# Altium schematic symbol library Hydra_Ref_sch.SCHLIB: 791 symbols (part 2 of 5)
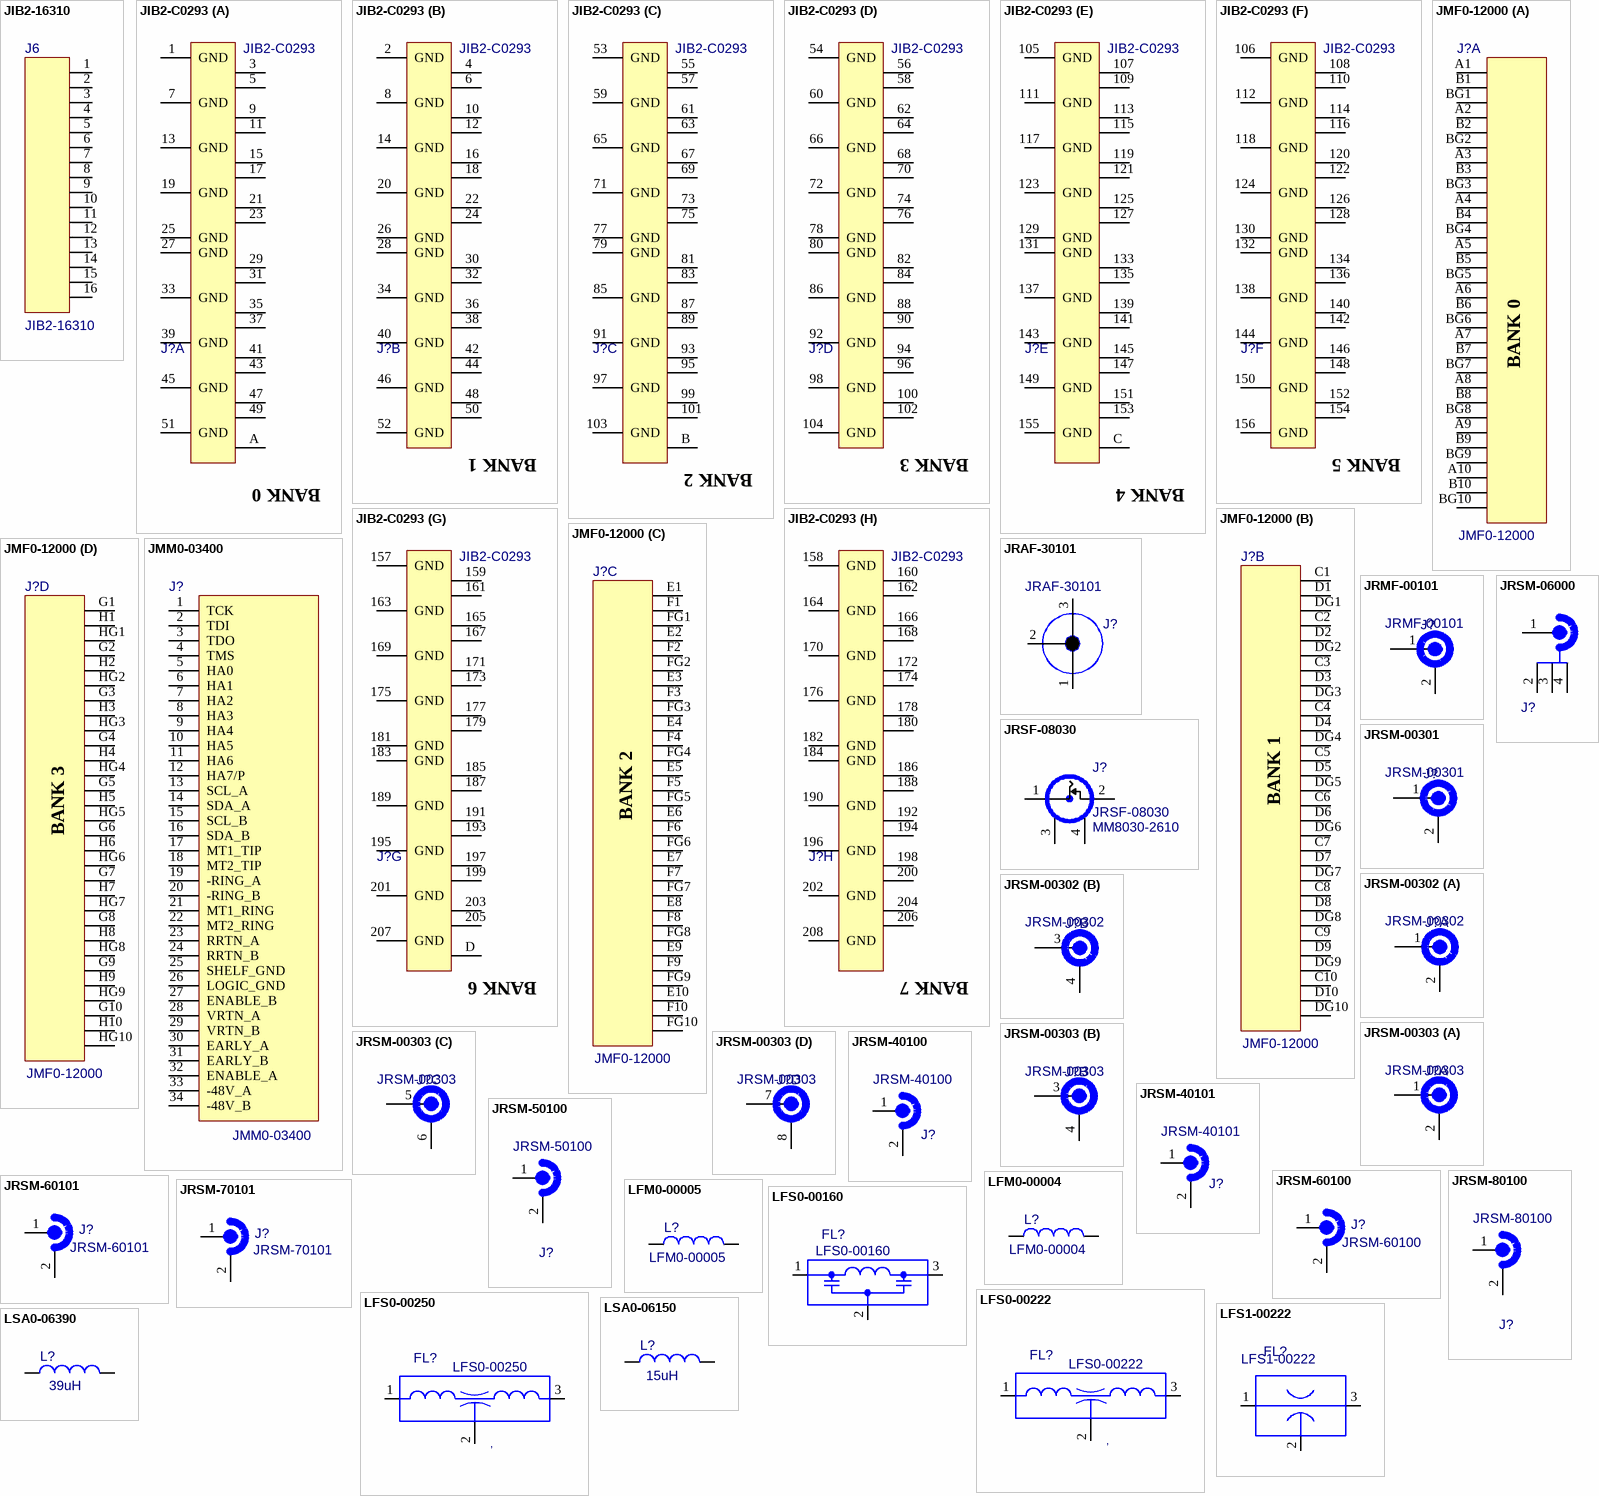
[diagram p23: symbols JIB2-16310 to LSA0-06390]

## JMF0-12000
designator J?, comment G_PN: JMF0-12000  (hidden comment: CONN;8-SIG/4-GND X 10 COL;FEM;RT ANG;PRESS-FIT;TCA;Z-PACK)
NoLoad: .; M_PN: 649001-1; Approved: CL; Value: 649001-1; MFGR: TYCO; level: 1; ModifyDate: 5/10/12; item_number: JMF0-12000
footprint CONN-JMF0-12000 (CONN; 8-SIG/4-GNDX10 COL;RT ANG; PRESS-FIT; Z-PACK)
part A pins: A1, A2, A3, A4, A5, A6, A7, A8, A9, A10, B1, B2, B3, B4, B5, B6, B7, B8, B9, B10, BG1, BG2, BG3, BG4, BG5, BG6, BG7, BG8, BG9, BG10
part B pins: C1, C2, C3, C4, C5, C6, C7, C8, C9, C10, D1, D2, D3, D4, D5, D6, D7, D8, D9, D10, DG1, DG2, DG3, DG4, DG5, DG6, DG7, DG8, DG9, DG10
part C pins: E1, E2, E3, E4, E5, E6, E7, E8, E9, E10, F1, F2, F3, F4, F5, F6, F7, F8, F9, F10, FG1, FG2, FG3, FG4, FG5, FG6, FG7, FG8, FG9, FG10
part D pins: G1, G2, G3, G4, G5, G6, G7, G8, G9, G10, H1, H2, H3, H4, H5, H6, H7, H8, H9, H10, HG1, HG2, HG3, HG4, HG5, HG6, HG7, HG8, HG9, HG10
part A text: BANK 0
part B text: BANK 1
part C text: BANK 2
part D text: BANK 3

## JMM0-03400
designator J?, comment G_PN: JMM0-03400  (hidden comment: CONN;26-1AMP & 8-6A;MALE;RT ANG;PC MT;PRESS-FIT;ATCA)
NoLoad: .; Approved: CL; Value: 176650-1; MFGR: TE; level: 1; ModifyDate: 5/10/12; M_PN: 176650-1; item_number: JMM0-03400
footprint CONN-JMF0-03400
pins: 1 TCK, 2 TDI, 3 TDO, 4 TMS, 5 HA0, 6 HA1, 7 HA2, 8 HA3, 9 HA4, 10 HA5, 11 HA6, 12 HA7/P, 13 SCL_A, 14 SDA_A, 15 SCL_B, 16 SDA_B, 17 MT1_TIP, 18 MT2_TIP, 19 -RING_A, 20 -RING_B, 21 MT1_RING, 22 MT2_RING, 23 RRTN_A, 24 RRTN_B, 25 SHELF_GND, 26 LOGIC_GND, 27 ENABLE_B, 28 VRTN_A, 29 VRTN_B, 30 EARLY_A, 31 EARLY_B, 32 ENABLE_A, 33 -48V_A, 34 -48V_B

## JRAF-30101
designator J?, comment G_PN: JRAF-30101  (hidden comment: SMA Right ANgle Jack PCB)
MFGR: Rosenberger; Approved: NM; NoLoad: .; M_PN: 32K243-40ML5; level: 1; ModifyDate: 11/14/12; item_number: JRAF-30101
footprint SMA -32K243-40ML5
footprint SMA_32K243-40ML5
pins: 1, 2, 3

## JRMF-00101
designator J?, comment G_PN: JRMF-00101  (hidden comment: MCX F PC MOUNT RIGHT ANGLE .1)
Value: 85MCX-50-0-10; MFGR: RADIAL; Approved: CL; NoLoad: .; level: 1; M_PN: 85MCX-50-0-10; ModifyDate: 4/21/12; item_number: JRMF-00101
pins: 1, 2 GND

## JRSF-08030
designator J?  M_PN: MM8030-2610  G_PN: JRSF-08030
SWG TYPE; FEMALE;SPST SWITCH CONNECTOR;STRAIGHT;SMT; Value: MM8030-2610; MFGR: MURATA; NoLoad: .; level: 1; ModifyDate: 8/21/13; item_number: JRSF-08030
footprint CONN-JRSF-MURATA-MM8030-2610 (SWG Type F SMT receptacle, integrated SPST switch)
pins: 1 RFIN, 2 GND, 3 GND1, 4 GND2

## JRSM-00301
designator J?, comment G_PN: JRSM-00301  (hidden comment: SMPM;SB EDGE LAUNCH;MALE;1 PORT)
Value: 3211-60035; MFGR: SV MICROWAVE; Approved: CL; NoLoad: .; level: 1; M_PN: 3211-60035; ModifyDate: 5/14/12; item_number: JRSM-00301
footprint CONN-3211-60035_plane_cutout (SMPM MALE 1 PORT EDGE MOUNT - SV Microwave, Inc)
pins: 1, 2 GND

## JRSM-00302
designator J?, comment G_PN: JRSM-00302  (hidden comment: SMPM;SB EDGE LAUNCH;MALE;2 PORT)
Value: 3211-60103; MFGR: SV MICROWAVE; Approved: CL; NoLoad: .; level: 1; M_PN: 3211-60103; ModifyDate: 5/14/12; item_number: JRSM-00302
footprint CONN-3211-60103 (SMPM SB MALE 2 PORT EDGE MOUNT - SV Microwave, Inc)
part A pins: 1, 2 GND
part B pins: 3, 4 GND

## JRSM-00303
designator J?, comment G_PN: JRSM-00303  (hidden comment: SMPM;SB EDGE LAUNCH;MALE;4 PORT)
Value: 3211-60102; MFGR: SV MICROWAVE; Approved: CL; NoLoad: .; level: 1; M_PN: 3211-60102; ModifyDate: 5/14/12; item_number: JRSM-00303
footprint CONN-3211-60102 (SMPM SB MALE 4 PORT EDGE MOUNT - SV Microwave, Inc)
part A pins: 1, 2 GND
part B pins: 3, 4 GND
part C pins: 5, 6 GND
part D pins: 7, 8 GND

## JRSM-06000
designator J?, comment SSMT;M;PCB;.177X.197X.081;SURF MT  (value not drawn)
Value: 2367-0000-54; MFGR: M/ACOM; G_PN: JRSM-06000; NoLoad: .; Approved: CL; level: 1; M_PN: 2367-0000-54; ModifyDate: 3/16/12; item_number: JRSM-06000
footprint CONN-2367-0000-54 (STRAIGHT OSMT PCB MOUNT PLUG RECEPTACLE -AMP)
pins: 1 CNTR, 2 GND, 3 GND, 4 GND

## JRSM-40100
designator J?, comment G_PN: JRSM-40100  (hidden comment: SMPM;FD;MALE;STRAIGHT;SMT;.152X.152X.150;PCB;R/A CONTACT)
Value: 3287-6100; MFGR: SV MICROWAVE; Approved: CL; NoLoad: .; level: 1; M_PN: 3287-6100; ModifyDate: 6/6/12; item_number: JRSM-40100
footprint CONN-3287-610X (SMMP;M;PCB;.152X.152X.150;SURF MT)
pins: 1 CNTR, 2 GND

## JRSM-40101
designator J?, comment G_PN: JRSM-40101  (hidden comment: SMPM;SB;MALE;STRAIGHT;SMT;.152X.152X.150;PCB;R/A CONTACT)
Value: 3287-6101; MFGR: SV MICROWAVE; Approved: CL; NoLoad: .; level: 1; M_PN: 3287-6101; ModifyDate: 4/10/13; item_number: JRSM-40101
footprint CONN-3287-610X (SMMP;M;PCB;.152X.152X.150;SURF MT)
pins: 1 CNTR, 2 GND

## JRSM-50100
designator J?, comment G_PN: JRSM-50100  (hidden comment: SMPM;FD;MALE;STRAIGHT;PCB;.145X.145X.194;PCB;4 LEG;THRU-HOLE)
Value: 3287-4100; MFGR: SV MICROWAVE; Approved: CL; NoLoad: .; level: 1; M_PN: 3287-4100; ModifyDate: 6/6/12; item_number: JRSM-50100
footprint CONN-JRSM-50100 (.094 PCB-MALE)
pins: 1 CNTR, 2 GND

## JRSM-60100
designator J?, comment G_PN: JRSM-60100  (hidden comment: SMPM FD MALE,STRAIGHT SMT, R/A COPLANAR, 4 PIN THRU-HOLE)
Value: B012-P93-02; MFGR: GILBERT; Approved: CL; NoLoad: .; level: 1; M_PN: B012-P93-02; ModifyDate: 6/6/12; item_number: JRSM-60100
footprint CONN-JRSM-60100_NO_TH_R (.063" PCB ONLY-MALE COMPANAR SURFACE MOUNT)
pins: 1 CNTR, 2 GND

## JRSM-60101
designator J?, comment G_PN: JRSM-60101  (hidden comment: SMPM SM MALE,STRAIGHT SMT, R/A COPLANAR, 4 PIN THRU-HOLE)
Value: B012-P95-02; MFGR: GILBERT; Approved: CL; NoLoad: .; level: 1; M_PN: B012-P95-02; ModifyDate: 1/6/14; item_number: JRSM-60101
footprint CONN-JRSM-60100_NO_TH_R (.063" PCB ONLY-MALE COMPANAR SURFACE MOUNT)
pins: 1 CNTR, 2 GND

## JRSM-70101
designator J?, comment G_PN: JRSM-70101  (hidden comment: SMPM FD MALE,STRAIGHT SMT, R/A COPLANAR, 4 PIN THRU-HOLE)
Value: B012-P93-02; MFGR: GILBERT; Approved: CL; NoLoad: .; level: 1; M_PN: B012-P93-02; ModifyDate: 10/15/14; item_number: JRSM-70101
footprint CONN-JRSM-60100_NO_TH_R (.063" PCB ONLY-MALE COMPANAR SURFACE MOUNT)
pins: 1 CNTR, 2 GND

## JRSM-80100
designator J?, comment G_PN: JRSM-80100  (hidden comment: SMPM;FD;MALE;STRAIGHT;SMT;.152X.152X.150;PCB;R/A CONTACT)
Value: B012-P93-01; MFGR: Corning Gilbert; Approved: CL; NoLoad: .; level: 1; M_PN: B012-P93-01; ModifyDate: 10/15/14; item_number: JRSM-80100
footprint CONN-3287-610X (SMMP;M;PCB;.152X.152X.150;SURF MT)
pins: 1 CNTR, 2 GND

## LFM0-00004
designator L?, comment G_PN: LFM0-00004  (hidden comment: EMI FLTR;CHIP;1A;300-330 OHMS@100M;0805)
MFGR: ASSOCIATED COMPONENTS TECH; NoLoad: .; Approved: CL; M_PN: CBC0805-300-102; level: 1; ModifyDate: 4/9/12; item_number: LFM0-00004
footprint IND-0805-RF (CB*0805 ACT Inc)
pins: 1, 2

## LFM0-00005
designator L?, comment G_PN: LFM0-00005  (hidden comment: EMI FILTER;CHIP;330 OHMS@100MHZ;0.5A;0.30 DCR;0603)
MFGR: MuRata; NoLoad: .; Approved: NM; M_PN: BLM18AG331SN1; level: 1; ModifyDate: 10/24/12; item_number: LFM0-00005
footprint BLM18A_Murata (EMI FILTER, 0603)
pins: 1, 2

## LFS0-00160
designator FL?, comment G_PN: LFS0-00160  (hidden comment: F/T FILTER;CHIP;3A;16V;PI LC;16PF;400MHz;0805)
Approved: CL; NoLoad: .; M_PN: NFL21SP407X1C3D; MFGR: MURATA; level: 1; ModifyDate: 3/25/13; Value: 16pF; item_number: LFS0-00160
footprint FIL-0805-MUR (Footprint not found)
pins: 1 IN, 2 GND, 3 OUT

## LFS0-00222
designator FL?, comment G_PN: LFS0-00222  (hidden comment: Filter EMI 2200PF,1206)
Approved: CL; NoLoad: .; M_PN: NFE31PT222Z1E9BL; MFGR: MURATA; level: 1; ModifyDate: 02/22/12; Value: 2200pF; item_number: LFS0-00222
footprint FIL-NFE31P-1206-4P (Chip EMIFIL LC Combined Type NFE31P(1206 Size), 3.2mmX1.6mmX1.6mm)
pins: 1 IN, 2 GND, 3 OUT
text: ,

## LFS0-00250
designator FL?, comment G_PN: LFS0-00250  (hidden comment: F/T FILTER;CHIP;2.5 DCR150MA;16V;T LC;25PF;200MHz;0603)
Approved: NM; NoLoad: .; M_PN: NFL18ST207X1C3; MFGR: MURATA; level: 1; ModifyDate: 02/22/12; Value: 25pF; item_number: LFS0-00250
footprint FIL-NFL18ST (0603 series NFL18ST)
pins: 1 IN, 2 GND, 3 OUT
text: ,

## LFS1-00222
designator FL?, comment G_PN: LFS1-00222  (hidden comment: NFM18CC222R1C3)
2200 PF FEED THRU FILTER 0603; Value: 2200pF; Approved: NM; MFGR: muRata; NoLoad: .; level: 1; ModifyDate: 11/14/12; M_PN: NFM18CC222R1C3; item_number: LFS1-00222
footprint FIL-NFL18C (0603 series NFL18C)
pins: 1, 2, 3

## LSA0-06150
designator L?, comment 15uH
IND; 15UH; 5%; 30MHZ SRF; 3.7 OHM; 1008; M_PN: 1008LS-153XJLB; G_PN: LSA0-06150; NoLoad: .; MFGR: Coilcraft; Approved: CL; level: 1; ModifyDate: 3/10/11; Value: 15uH; item_number: LSA0-06150
footprint IND-1008CS (Coilcraft 1008CS SM Inductor 115X110X80(mil))
pins: 1, 2

## LSA0-06390
designator L?, comment value 39uH  (hidden comment: IND; 39UH; 5%; 26MHZ SRF; 10 OHM; 1008)
G_PN: LSA0-06390; M_PN: 1008LS-393XJLB; NoLoad: .; Approved: CL; MFGR: COILCRAFT; level: 1; ModifyDate: 3/23/12; item_number: LSA0-06390
footprint IND-1008CS (Coilcraft 1008CS SM Inductor 115X110X80(mil))
pins: 1, 2

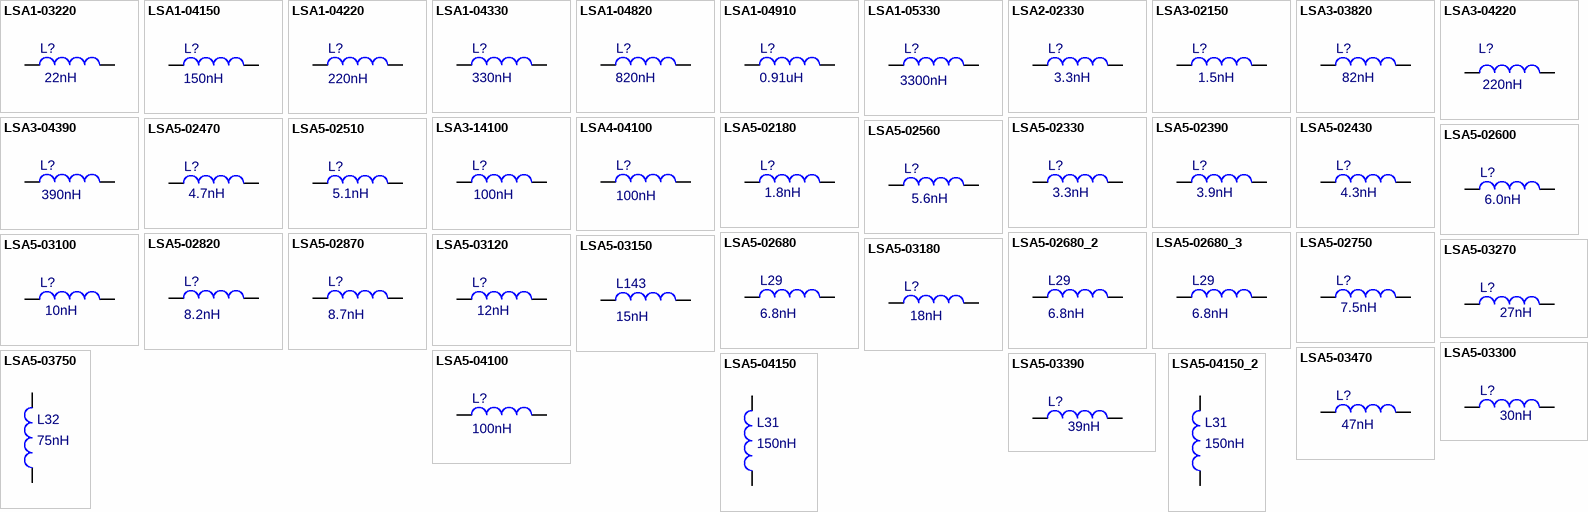
[diagram p6: symbols LSA1-03220 to LSA5-04150_2]

## LSA1-03220
designator L?, comment value 22nH  (hidden comment: INDUCTOR;22NH;5%;1008;.115X.110;SMT)
G_PN: LSA1-03220; M_PN: 1008CS-220XJLB; MFGR: COILCRAFT; NoLoad: .; Approved: CL; level: 1; ModifyDate: 02/22/12; item_number: LSA1-03220
footprint IND-1008CS (Coilcraft 1008CS SM Inductor 115X110X80(mil))
pins: 1, 2

## LSA1-04150
designator L?, comment value 150nH  (hidden comment: INDUCTOR;.15 UH;2%;850 MHZ SRF;45Q @100MHZ;.7 DCR;580MA;WIREWOUND;1008)
G_PN: LSA1-04150; M_PN: 1008CS-151XGLB; MFGR: COILCRAFT; NoLoad: .; Approved: CL; level: 1; ModifyDate: 02/22/12; item_number: LSA1-04150
footprint IND-1008CS (Coilcraft 1008CS SM Inductor 115X110X80(mil))
pins: 1, 2

## LSA1-04220
designator L?, comment value 220nH  (hidden comment: INDUCTOR;220NH;2%;1008;.115X.110;SMT)
G_PN: LSA1-04220; MFGR: COILCRAFT; NoLoad: .; Approved: CL; M_PN: 1008CS-221XGLB; level: 1; ModifyDate: 4/11/12; item_number: LSA1-04220
footprint IND-1008CS (Coilcraft 1008CS SM Inductor 115X110X80(mil))
pins: 1, 2

## LSA1-04330
designator L?, comment value 330nH  (hidden comment: INDUCTOR;.33 UH;5%;570 MHZ SRF;45Q @100MHZ;1.05 DCR;450MA;WIREWOUND;1008)
M_PN: 1008CS-331XJLB; G_PN: LSA1-04330; NoLoad: .; Approved: CL; MFGR: COILCRAFT; level: 1; ModifyDate: 02/22/12; item_number: LSA1-04330
footprint IND-1008CS (Coilcraft 1008CS SM Inductor 115X110X80(mil))
pins: 1, 2

## LSA1-04820
designator L?, comment value 820nH  (hidden comment: INDUCTOR;.82UH;5%;350 MHZ SRF;45Q @100MHZ;1.61 DCR;400MA;WIREWOUND;1008)
MFGR: COILCRAFT; NoLoad: .; Approved: CL; M_PN: 1008CS-821XJLB; G_PN: LSA1-04820; level: 1; ModifyDate: 02/22/12; item_number: LSA1-04820
footprint IND-1008CS (Coilcraft 1008CS SM Inductor 115X110X80(mil))
pins: 1, 2

## LSA1-04910
designator L?, comment value 0.91uH  (hidden comment: INDUCTOR;0.91UH;5%;320MHZ SRF;35Q @50MHZ;1.68 DCR;.38A;1008)
MFGR: COILCRAFT; NoLoad: .; Approved: NM; M_PN: 1008CS-911XJLU; G_PN: LSA1-04910; level: 1; ModifyDate: 10/24/12; item_number: LSA1-04910
footprint IND-1008CS (Coilcraft 1008CS SM Inductor 115X110X80(mil))
pins: 1, 2

## LSA1-05330
designator L?, comment value 3300nH  (hidden comment: 3.3 UH;5%;110MHZ SRF;22Q @25MHZ;3.4 OHMS;.29A;1008)
G_PN: LSA1-05330; M_PN: 1008CS-332XJLB; MFGR: COILCRAFT; NoLoad: .; Approved: CL; level: 1; ModifyDate: 5/16/12; item_number: LSA1-05330
footprint IND-1008CS (Coilcraft 1008CS SM Inductor 115X110X80(mil))
pins: 1, 2

## LSA2-02330
designator L?, comment value 3.3nH  (hidden comment: INDUCTOR;3.3NH;2%;12.8G SRF;95Q @1.7G;.045DCR;1.7A;0402)
G_PN: LSA2-02330; NoLoad: .; Approved: CL; M_PN: 0402HP-3N3XGLU; MFGR: COILCRAFT; level: 1; ModifyDate: 2/14/13; item_number: LSA2-02330
footprint IND-0402CS (Coilcraft 0402CS SM Inductor 47X25X26(mil))
pins: 1, 2

## LSA3-02150
designator L?, comment value 1.5nH  (hidden comment: INDUCTOR;1.5NH;+/-.2NH;13GHZ SRF;50Q@.8GHZ;06)
G_PN: LSA3-02150; NoLoad: .; Approved: CL; M_PN: 5516 0158451; MFGR: STELCO; level: 1; ModifyDate: 09/19/12; item_number: LSA3-02150
footprint IND-0603CS-Stelco (Coilcraft 0603CS SM Inductor 71X44X40(mil))
pins: 1, 2

## LSA3-03820
designator L?, comment 82nH
INDUCTOR;82NH;5%;1G SRF;40Q@.5G;300MA;0603; G_PN: LSA3-03820; NoLoad: .; Approved: CL; M_PN: LL1608-FSL82NJ; MFGR: TOKO; level: 1; ModifyDate: 4/11/12; Value: 82nH; item_number: LSA3-03820
footprint IND-0603-LL1608FSL (METRIC 1608 With plarity marking)
pins: 1, 2

## LSA3-04220
designator L?, comment value 220nH  (hidden comment: INDUCTOR;220NH;1%;822MHz SRF;0603)
G_PN: LSA3-04220; NoLoad: .; Approved: CL; M_PN: 0603CS-R22XGLU; MFGR: COILCRAFT; level: 1; ModifyDate: 4/11/12; item_number: LSA3-04220
footprint IND-0603CS (Coilcraft 0603CS SM Inductor 71X44X40(mil))
pins: 1, 2

## LSA3-04390
designator L?, comment value 390nH  (hidden comment: INDUCTOR;390NH;5%;.78GHZ SRF;25Q;4.35 DCR;100MA;WIREWOUND;0603)
G_PN: LSA3-04390; M_PN: 0603CS-R39XJLU; NoLoad: .; Approved: CL; MFGR: COILCRAFT; level: 1; ModifyDate: 02/22/12; item_number: LSA3-04390
footprint IND-0603CS (Coilcraft 0603CS SM Inductor 71X44X40(mil))
pins: 1, 2

## LSA3-14100
designator L?, comment value 100nH  (hidden comment: INDUCTOR;100NH;5%;1.4GHZ SRF;34Q;.58 DCR;400MA;WIREWOUND;0603)
M_PN: 0603CS-R10XJBU; MFGR: COILCRAFT; NoLoad: .; Approved: CL; G_PN: LSA3-14100; level: 1; ModifyDate: 02/22/12; item_number: LSA3-14100
footprint IND-0603CS (Coilcraft 0603CS SM Inductor 71X44X40(mil))
pins: 1, 2

## LSA4-04100
designator L?, comment value 100nH  (hidden comment: INDUCTOR;100NH;5%;1G SRF;60Q@.35G;650MA;1008)
G_PN: LSA4-04100; MFGR: COILCRAFT; NoLoad: .; Approved: CL; M_PN: 1008CS-101XJLB; level: 1; ModifyDate: 12/13/12; item_number: LSA4-04100
footprint IND-1008CS (Coilcraft 1008CS SM Inductor 115X110X80(mil))
pins: 1, 2

## LSA5-02180
designator L?, comment value 1.8nH  (hidden comment: INDUCTOR;1.8NH;5%;16G SRF;65Q @1.7G;.18 DCR;.033A;0603)
G_PN: LSA5-02180; M_PN: 0603HP-1N8XJLU; MFGR: COILCRAFT; NoLoad: .; Approved: CL; level: 1; ModifyDate: 5/16/13; item_number: LSA5-02180
footprint IND-0603HP (Coilcraft 0603HP SM Inductor 69X43X37(mil))
pins: 1, 2

## LSA5-02330
designator L?, comment value 3.3nH  (hidden comment: INDUCTOR;3.3NH;2%;9.6G SRF;104Q @1.7G;.024 DCR;1.9A;0603)
G_PN: LSA5-02330; M_PN: 0603HP-3N3XGLU; MFGR: COILCRAFT; NoLoad: .; Approved: CL; level: 1; ModifyDate: 02/22/12; item_number: LSA5-02330
footprint IND-0603HP (Coilcraft 0603HP SM Inductor 69X43X37(mil))
pins: 1, 2

## LSA5-02390
designator L?, comment value 3.9nH  (hidden comment: INDUCTOR;3.9;2%;7.5GHZ SRF;108Q @1.7GHZ;.039 DCR;1.6A;0603)
G_PN: LSA5-02390; M_PN: 0603HP-3N9XGLU; MFGR: COILCRAFT; NoLoad: .; Approved: CL; level: 1; ModifyDate: 3/4/13; item_number: LSA5-02390
footprint IND-0603HP (Coilcraft 0603HP SM Inductor 69X43X37(mil))
pins: 1, 2

## LSA5-02430
designator L?, comment value 4.3nH  (hidden comment: INDUCTOR;4.3;2%;7.5GHZ SRF;91Q @1.7GHZ;.08 DCR;1.3A;0603)
G_PN: LSA5-02430; M_PN: 0603HP-4N3XGLU; MFGR: COILCRAFT; NoLoad: .; Approved: CL; level: 1; ModifyDate: 3/4/13; item_number: LSA5-02430
footprint IND-0603HP (Coilcraft 0603HP SM Inductor 69X43X37(mil))
pins: 1, 2

## LSA5-02470
designator L?, comment value 4.7nH  (hidden comment: INDUCTOR;4.7;2%;7.9GHZ SRF;75Q @1.7GHZ;.1 DCR;1.1A;0603)
G_PN: LSA5-02470; M_PN: 0603HP-4N7XGLU; MFGR: COILCRAFT; NoLoad: .; Approved: CL; level: 1; ModifyDate: 4/5/13; item_number: LSA5-02470
footprint IND-0603HP (Coilcraft 0603HP SM Inductor 69X43X37(mil))
pins: 1, 2

## LSA5-02510
designator L?, comment value 5.1nH  (hidden comment: INDUCTOR;5.1NH;2%;4.8G SRF;82Q @1.7G;.083 DCR;.8A;0603)
G_PN: LSA5-02510; M_PN: 0402CS-5N1XGLU; MFGR: COILCRAFT; NoLoad: .; Approved: CL; level: 1; ModifyDate: 02/22/13; item_number: LSA5-02510
footprint IND-0402CS (Coilcraft 0402CS SM Inductor 47X25X26(mil))
pins: 1, 2

## LSA5-02560
designator L?, comment value 5.6nH  (hidden comment: INDUCTOR;5.6NH;2%;6.6GHZ SRF;145Q @1.7GHZ;.036 DCR;1.7A;0603)
G_PN: LSA5-02560; M_PN: 0603HP-5N6XGLU; MFGR: COILCRAFT; NoLoad: .; Approved: CL; level: 1; ModifyDate: 02/22/13; item_number: LSA5-02560
footprint IND-0603HP (Coilcraft 0603HP SM Inductor 69X43X37(mil))
pins: 1, 2

## LSA5-02600
designator L?, comment value 6.0nH  (hidden comment: INDUCTOR;6NH;2%;6GHZ SRF;154Q @1.7GHZ;.036 DCR;1.7A;0603)
G_PN: LSA5-02600; M_PN: 0603HP-6N0XGLU; MFGR: COILCRAFT; NoLoad: .; Approved: CL; level: 1; ModifyDate: 4/6/13; item_number: LSA5-02600
footprint IND-0603HP (Coilcraft 0603HP SM Inductor 69X43X37(mil))
pins: 1, 2

## LSA5-02680
designator L29, comment value 6.8nH  (hidden comment: INDUCTOR;6.8NH;2%;5.8G SRF;143Q @1.7G;.042 DCR;1.4A;0603)
G_PN: LSA5-02680; M_PN: 0603HP-6N8XGLU; MFGR: COILCRAFT; NoLoad: .; Approved: CL; level: 1; line_number: 550; ModifyDate: 2/20/13; item_number: LSA5-02680
footprint IND-0603HP (Coilcraft 0603HP SM Inductor 69X43X37(mil))
pins: 1, 2

## LSA5-02680_2
designator L29, comment value 6.8nH  (hidden comment: INDUCTOR;6.8NH;2%;5.8G SRF;143Q @1.7G;.042 DCR;1.4A;0603)
G_PN: LSA5-02680; M_PN: 0603HP-6N8XGLU; MFGR: COILCRAFT; NoLoad: .; Approved: CL; level: 1; line_number: 550; ModifyDate: 2/20/13; item_number: LSA5-02680
footprint IND-0603HP (Coilcraft 0603HP SM Inductor 69X43X37(mil))
pins: 1, 2

## LSA5-02680_3
designator L29, comment value 6.8nH  (hidden comment: INDUCTOR;6.8NH;2%;5.8G SRF;143Q @1.7G;.042 DCR;1.4A;0603)
G_PN: LSA5-02680; M_PN: 0603HP-6N8XGLU; MFGR: COILCRAFT; NoLoad: .; Approved: CL; level: 1; line_number: 550; ModifyDate: 2/20/13; item_number: LSA5-02680
footprint IND-0603HP (Coilcraft 0603HP SM Inductor 69X43X37(mil))
pins: 1, 2

## LSA5-02750
designator L?, comment value 7.5nH  (hidden comment: INDUCTOR;7.5NH;2%;5.3GHZ SRF;112Q @1.7GHZ;.080 DCR;1.3A;0603)
G_PN: LSA5-02750; M_PN: 0603HP-7N5XGLU; MFGR: COILCRAFT; NoLoad: .; Approved: CL; level: 1; ModifyDate: 3/4/13; item_number: LSA5-02750
footprint IND-0603HP (Coilcraft 0603HP SM Inductor 69X43X37(mil))
pins: 1, 2

## LSA5-02820
designator L?, comment value 8.2nH  (hidden comment: INDUCTOR;8.2NH;2%;5.9G SRF;148Q @1.7G;.054 DCR;1.4A;0603)
G_PN: LSA5-02820; M_PN: 0603HP-8N2XGLU; MFGR: COILCRAFT; NoLoad: .; Approved: CL; level: 1; ModifyDate: 03/20/12; item_number: LSA5-02820
footprint IND-0603HP (Coilcraft 0603HP SM Inductor 69X43X37(mil))
pins: 1, 2

## LSA5-02870
designator L?, comment value 8.7nH  (hidden comment: INDUCTOR;8.7NH;2%;5.5G SRF;149Q @1.7G;.054 DCR;1.4A;0603)
G_PN: LSA5-02870; M_PN: 0603HP-8N7XGLU; MFGR: COILCRAFT; NoLoad: .; Approved: CL; level: 1; ModifyDate: 02/22/13; item_number: LSA5-02870
footprint IND-0603HP (Coilcraft 0603HP SM Inductor 69X43X37(mil))
pins: 1, 2

## LSA5-03100
designator L?, comment value 10nH  (hidden comment: INDUCTOR;10NH;2%;4.3GHZ SRF;142Q @1.7GHZ;.048 DCR;1.4A;0603)
G_PN: LSA5-03100; MFGR: COILCRAFT; NoLoad: .; Approved: CL; M_PN: 0603HP-10NXGLU; level: 1; ModifyDate: 3/4/13; item_number: LSA5-03100
footprint IND-0603HP (Coilcraft 0603HP SM Inductor 69X43X37(mil))
pins: 1, 2

## LSA5-03120
designator L?, comment value 12nH  (hidden comment: INDUCTOR;12NH;2%;4.1G SRF;69Q @0.9G;.088 DCR;1.1A;0603)
G_PN: LSA5-03120; MFGR: COILCRAFT; NoLoad: .; Approved: CL; M_PN: 0603HP-12NXGLU; level: 1; ModifyDate: 5/16/12; item_number: LSA5-03120
footprint IND-0603HP (Coilcraft 0603HP SM Inductor 69X43X37(mil))
pins: 1, 2

## LSA5-03150
designator L143, comment value 15nH  (hidden comment: INDUCTOR;15NH;2%;3.6G SRF;83Q @0.9G;.054 DCR;1.2A;0603)
G_PN: LSA5-03150; MFGR: COILCRAFT; NoLoad: .; Approved: CL; M_PN: 0603HP-15NXGLU; level: 1; line_number: 540; ModifyDate: 2/20/13; item_number: LSA5-03150
footprint IND-0603HP (Coilcraft 0603HP SM Inductor 69X43X37(mil))
pins: 1, 2

## LSA5-03180
designator L?, comment value 18nH  (hidden comment: INDUCTOR;18NH;2%;3.3G SRF;76Q @0.9G;.066 DCR;1.2A;0603)
G_PN: LSA5-03180; M_PN: 0603HP-18NXGLU; MFGR: COILCRAFT; NoLoad: .; Approved: CL; level: 1; ModifyDate: 02/22/12; item_number: LSA5-03180
footprint IND-0603HP (Coilcraft 0603HP SM Inductor 69X43X37(mil))
pins: 1, 2

## LSA5-03270
designator L?, comment value 27nH  (hidden comment: INDUCTOR;27NH;2%;2.8G SRF;74Q @0.9G;.150DCR;.78A;0603)
G_PN: LSA5-03270; M_PN: 0603HP-27NXGLU; MFGR: COILCRAFT; NoLoad: .; Approved: CL; level: 1; ModifyDate: 3/11/13; item_number: LSA5-03270
footprint IND-0603HP (Coilcraft 0603HP SM Inductor 69X43X37(mil))
pins: 1, 2

## LSA5-03300
designator L?, comment value 30nH  (hidden comment: INDUCTOR;30NH;2%;2.80G SRF;82Q @0.9G;.13 DCR;.92A;0603)
G_PN: LSA5-03300; M_PN: 0603HP-30NXGLU; MFGR: COILCRAFT; NoLoad: .; Approved: CL; level: 1; ModifyDate: 10/06/12; item_number: LSA5-03300
footprint IND-0603HP (Coilcraft 0603HP SM Inductor 69X43X37(mil))
pins: 1, 2

## LSA5-03390
designator L?, comment value 39nH  (hidden comment: INDUCTOR;39NH;2%;2.45G SRF;78Q @0.9G;.19 DCR;.68A;0603)
G_PN: LSA5-03390; M_PN: 0603HP-39NXGLU; MFGR: COILCRAFT; NoLoad: .; Approved: CL; level: 1; ModifyDate: 02/22/12; item_number: LSA5-03390
footprint IND-0603HP (Coilcraft 0603HP SM Inductor 69X43X37(mil))
pins: 1, 2

## LSA5-03470
designator L?, comment value 47nH  (hidden comment: INDUCTOR;47NH;2%;2.3G SRF;77Q @0.9G;.24 DCR;.68A;0603)
G_PN: LSA5-03470; M_PN: 0603HP-47NXGLU; MFGR: COILCRAFT; NoLoad: .; Approved: CL; level: 1; ModifyDate: 02/22/12; item_number: LSA5-03470
footprint IND-0603HP (Coilcraft 0603HP SM Inductor 69X43X37(mil))
pins: 1, 2

## LSA5-03750
designator L32, comment value 75nH  (hidden comment: INDUCTOR;75NH;2%;1.9G SRF;71Q @0.9G;.52 DCR;.5A;0603)
G_PN: LSA5-03750; M_PN: 0603HP-75NXGLU; MFGR: COILCRAFT; NoLoad: .; Approved: CL; level: 1; line_number: 560; ModifyDate: 02/22/12; item_number: LSA5-03750
footprint IND-0603HP (Coilcraft 0603HP SM Inductor 69X43X37(mil))
pins: 1, 2

## LSA5-04100
designator L?, comment value 100nH  (hidden comment: INDUCTOR;100NH;5%;1.2G SRF;40Q@.25G;420mA;1008HT)
G_PN: LSA5-04100; MFGR: COILCRAFT; NoLoad: .; Approved: CL; M_PN: 1008HT-R10TJLB; level: 1; ModifyDate: 2/19/15; item_number: LSA5-04100
footprint IND-1008HT (Coilcraft 1008HT SM Inductor 105X95X45(mil))
pins: 1, 2

## LSA5-04150
designator L31, comment value 150nH  (hidden comment: INDUCTOR;150NH;2%;1.35G SRF;188Q @0.9G;.082 DCR;.39A;0603)
G_PN: LSA5-04150; MFGR: COILCRAFT; NoLoad: .; Approved: CL; M_PN: 0603HP-R15XGLU; level: 1; line_number: 555; ModifyDate: 5/16/12; item_number: LSA5-04150
footprint IND-0603HP (Coilcraft 0603HP SM Inductor 69X43X37(mil))
pins: 1, 2

## LSA5-04150_2
designator L31, comment value 150nH  (hidden comment: INDUCTOR;150NH;2%;1.35G SRF;188Q @0.9G;.082 DCR;.39A;0603)
G_PN: LSA5-04150; MFGR: COILCRAFT; NoLoad: .; Approved: CL; M_PN: 0603HP-R15XGLU; level: 1; line_number: 555; ModifyDate: 5/16/12; item_number: LSA5-04150
footprint IND-0603HP (Coilcraft 0603HP SM Inductor 69X43X37(mil))
pins: 1, 2

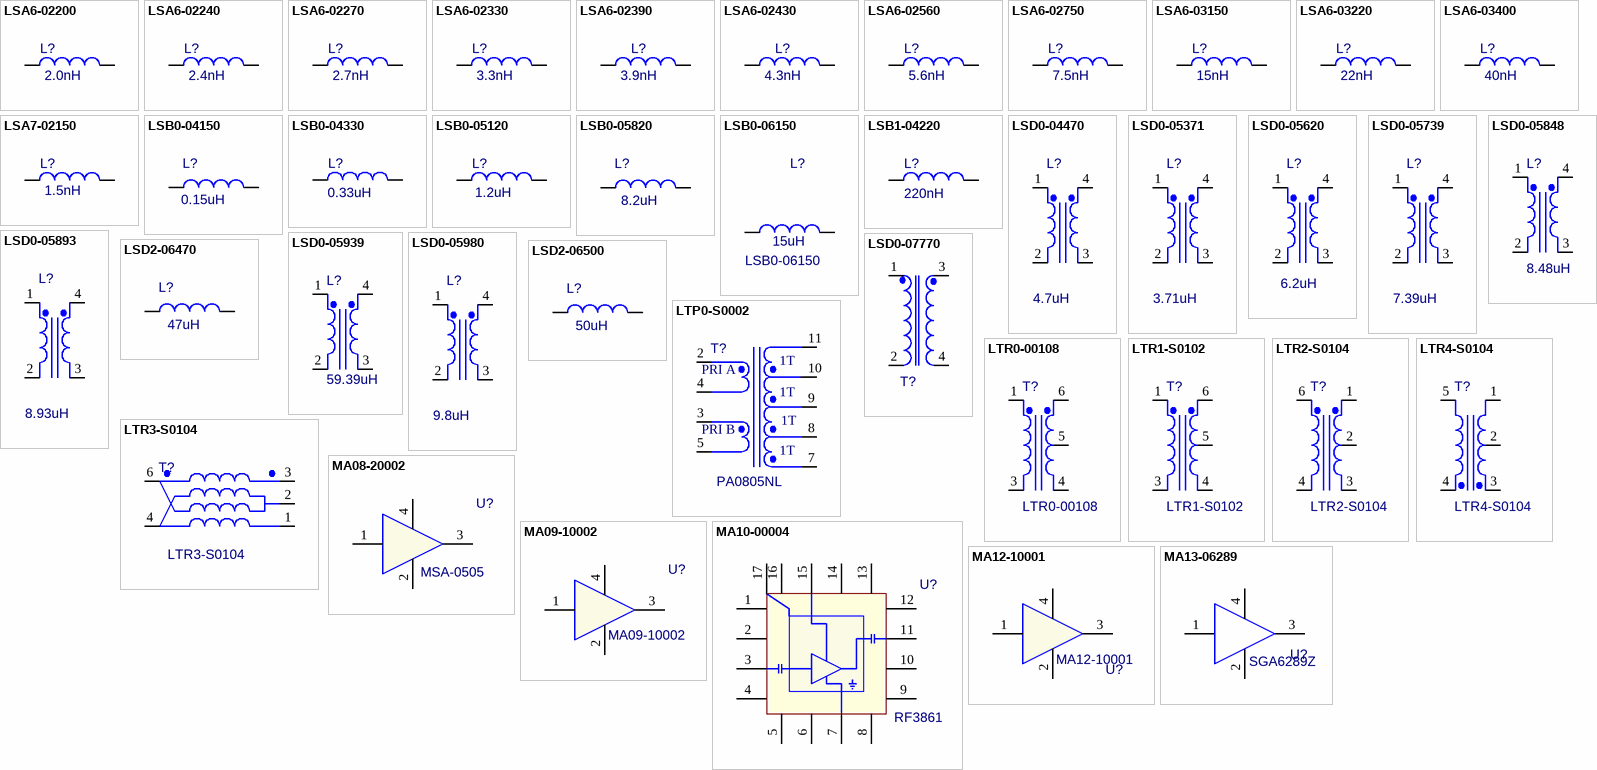
[diagram p7: symbols LSA6-02200 to MA13-06289]

## LSA6-02200
designator L?, comment value 2.0nH  (hidden comment: INDUCTOR;2.0NH;5%;15.2GHZ SRF;85Q @1.7GHZ;.038 DCR;2.1A;0402)
G_PN: LSA6-02200; M_PN: 0402HP-2N0XJLU; MFGR: COILCRAFT; NoLoad: .; Approved: CL; level: 1; ModifyDate: 3/13/13; item_number: LSA6-02200
footprint IND-0402HP (Coilcraft 0402CS SM Inductor 47X25X26(mil))
pins: 1, 2

## LSA6-02240
designator L?, comment value 2.4nH  (hidden comment: INDUCTOR;2.4NH;2%;14GHZ SRF;83Q @1.7GHZ;.042 DCR;2A;0402)
G_PN: LSA6-02240; M_PN: 0402HP-2N4XGLU; MFGR: COILCRAFT; NoLoad: .; Approved: CL; level: 1; ModifyDate: 8/18/14; item_number: LSA6-02240
footprint IND-0402HP (Coilcraft 0402CS SM Inductor 47X25X26(mil))
pins: 1, 2

## LSA6-02270
designator L?, comment value 2.7nH  (hidden comment: INDUCTOR;2.7NH;2%;13GHZ SRF;85Q @1.7GHZ;.056 DCR;1.5A;0402)
G_PN: LSA6-02270; M_PN: 0402HP-2N7XGLU; MFGR: COILCRAFT; NoLoad: .; Approved: CL; level: 1; ModifyDate: 3/13/13; item_number: LSA6-02270
footprint IND-0402HP (Coilcraft 0402CS SM Inductor 47X25X26(mil))
pins: 1, 2

## LSA6-02330
designator L?, comment value 3.3nH  (hidden comment: INDUCTOR;3.3NH;2%;12.8G SRF;95Q @1.7G;.045DCR;1.7A;0402)
G_PN: LSA6-02330; M_PN: 0402HP-3N3XGLU; MFGR: COILCRAFT; NoLoad: .; Approved: CL; level: 1; ModifyDate: 12/4/14; item_number: LSA6-02330
footprint IND-0402HP (Coilcraft 0402CS SM Inductor 47X25X26(mil))
pins: 1, 2

## LSA6-02390
designator L?, comment value 3.9nH  (hidden comment: INDUCTOR;3.9NH;2%;9.5GHZ SRF;98Q @1.7GHZ;.045 DCR;1.7A;0402)
G_PN: LSA6-02390; M_PN: 0402HP-3N9XGLU; MFGR: COILCRAFT; NoLoad: .; Approved: CL; level: 1; ModifyDate: 3/13/13; item_number: LSA6-02390
footprint IND-0402HP (Coilcraft 0402CS SM Inductor 47X25X26(mil))
pins: 1, 2

## LSA6-02430
designator L?, comment value 4.3nH  (hidden comment: INDUCTOR;4.3NH;2%;7.15GHZ SRF;90Q @1.7GHZ;.050 DCR;1.6A;0402)
G_PN: LSA6-02430; M_PN: 0402HP-4N3XJLW; MFGR: COILCRAFT; NoLoad: .; Approved: CL; level: 1; ModifyDate: 9/8/14; item_number: LSA6-02430
footprint IND-0402HP (Coilcraft 0402CS SM Inductor 47X25X26(mil))
pins: 1, 2

## LSA6-02560
designator L?, comment value 5.6nH  (hidden comment: INDUCTOR;5.6NH;2%;6.6GHZ SRF;105Q @1.7GHZ;.048 DCR;1.6A;0402)
G_PN: LSA6-02560; M_PN: 0402HP-5N6XGLU; MFGR: COILCRAFT; NoLoad: .; Approved: CL; level: 1; ModifyDate: 3/4/13; item_number: LSA6-02560
footprint IND-0402HP (Coilcraft 0402CS SM Inductor 47X25X26(mil))
pins: 1, 2

## LSA6-02750
designator L?, comment value 7.5nH  (hidden comment: INDUCTOR;7.5NH;2%;5.4GHZ SRF;82Q @1.7GHZ;.080 DCR;1.4A;0402)
G_PN: LSA6-02750; M_PN: 0402HP-7N5XGLU; MFGR: COILCRAFT; NoLoad: .; Approved: CL; level: 1; ModifyDate: 3/18/13; item_number: LSA6-02750
footprint IND-0402HP (Coilcraft 0402CS SM Inductor 47X25X26(mil))
pins: 1, 2

## LSA6-03150
designator L?, comment value 15nH  (hidden comment: INDUCTOR;15NH;2%;3.9GHZ SRF;85Q @1.7GHZ;.078 DCR;1.1A;0402)
G_PN: LSA6-03150; M_PN: 0402HP-15NXGLU; MFGR: COILCRAFT; NoLoad: .; Approved: CL; level: 1; ModifyDate: 3/8/13; item_number: LSA6-03150
footprint IND-0402HP (Coilcraft 0402CS SM Inductor 47X25X26(mil))
pins: 1, 2

## LSA6-03220
designator L?, comment value 22nH  (hidden comment: INDUCTOR;22NH;2%;3.3GHZ SRF;74Q @1.7GHZ;0.160 DCR;0.8A;0402)
G_PN: LSA6-03220; M_PN: 0402HP-22NXGLU; MFGR: COILCRAFT; NoLoad: .; Approved: CL; level: 1; ModifyDate: 6/20/14; item_number: LSA6-03220
footprint IND-0402HP (Coilcraft 0402CS SM Inductor 47X25X26(mil))
pins: 1, 2

## LSA6-03400
designator L?, comment value 40nH  (hidden comment: ININDUCTOR;40NH;2%;2.24GHZ SRF;33Q @1.7GHZ;.44DCR;.32A;0402)
G_PN: LSA6-03400; M_PN: 0402CS-40NXGLU; MFGR: COILCRAFT; NoLoad: .; Approved: CL; level: 1; ModifyDate: 8/18/14; item_number: LSA6-03400
footprint IND-0402CS (Coilcraft 0402CS SM Inductor 47X25X26(mil))
pins: 1, 2

## LSA7-02150
designator L?, comment value 1.5nH  (hidden comment: INDUCTOR;1.5NH;5%;17GHZ SRF;40Q @1.7GHZ;.090 DCR;.6A;0201)
G_PN: LSA7-02150; M_PN: 0201DS-1N5XJEU; MFGR: COILCRAFT; NoLoad: .; Approved: CL; level: 1; ModifyDate: 3/13/13; item_number: LSA7-02150
footprint IND-0201DS (Footprint not found)
pins: 1, 2

## LSB0-04150
designator L?  value 0.15uH  (hidden comment: LSB0-04150)
INDUCTOR;.15 UH;10%;.126x.098;SMT; NoLoad: .; Approved: CL; M_PN: KL32TER15K; MFGR: KOA; level: 1; G_PN: LSB0-04150; ModifyDate: 4/23/12; item_number: LSB0-04150
footprint IND-1210-Pads20x67 (126X98X87 -Narrow Pads -.020x.067)
pins: 1, 2

## LSB0-04330
designator L?, comment value 0.33uH  (hidden comment: INDUCTOR;.33 UH;10%;.126x.098;SMT)
G_PN: LSB0-04330; NoLoad: .; Approved: CL; MFGR: KOA/SPEER; M_PN: KL32TER33K; level: 1; ModifyDate: 4/11/12; item_number: LSB0-04330
footprint IND-1210-N (126X98X60)
pins: 1, 2

## LSB0-05120
designator L?  value 1.2uH  (hidden comment: LSB0-05120)
IND; 1.2UH; 5%; 100MHZ SRF; .75 OHM; 1210; M_PN: KL32TTE1R2J; MFGR: KOA-SPEER; Approved: CL; NoLoad: .; level: 1; G_PN: LSB0-05120; ModifyDate: 4/13/12; item_number: LSB0-05120
pins: 1, 2

## LSB0-05820
designator L?, comment value 8.2uH  (hidden comment: INDUCTOR;8.2 UH;10%;40MHZ SRF;2.3OHM;1210)
G_PN: LSB0-05820; NoLoad: .; M_PN: KL32TE8R2K; Approved: CL; MFGR: KOA/SPEER; level: 1; ModifyDate: 4/12/12; item_number: LSB0-05820
footprint MC20A
pins: 1, 2

## LSB0-06150
designator L?, comment G_PN: LSB0-06150  (hidden comment: 15uH)
INDUCTOR;15UH;10%;30MHZ SRF;3.2OHM;1210; Approved: CL; NoLoad: .; M_PN: KL32TE150K; level: 1; ModifyDate: 5/11/12; Value: 15uH; item_number: LSB0-06150
footprint IND-1210-Pads24x31 (126X98X87 -Narrow Pads -.024x.031)
pins: 1, 2

## LSB1-04220
designator L?, comment value 220nH  (hidden comment: INDUCTOR; 220NH; 5%; 760MHZ SRF; .5 OHM; 1206)
M_PN: 1206CS-221XJLB; G_PN: LSB1-04220; MFGR: COILCRAFT; Approved: CL; NoLoad: .; level: 1; ModifyDate: 4/11/12; item_number: LSB1-04220
footprint IND-1206CS (Coilcraft 1206CS SM Inductor 140x85X60(mil))
pins: 1, 2

## LSD0-04470
designator L?, comment value 4.7uH  (hidden comment: IND; 4.7uH;20%;3.76uH@3.57A;.056 OHM;PARALLEL;.305X.305X.15H)
MFGR: BH ELECTRONICS; NoLoad: .; Approved: CL; G_PN: LSD0-04470; M_PN: L16-1010; level: 1; ModifyDate: 5/14/13; item_number: LSD0-04470
footprint L16_BH ELECTRONICS (Footprint not found)
footprint L16_BH_ELECTRONICS
pins: 1 Pri+, 2 Pri-, 3 Sec-, 4 Sec+

## LSD0-05371
designator L?, comment value 3.71uH  (hidden comment: IND;3.71uH;20%;2.97uH@4.01A;.039 OHM;PARALLEL;.305X.305X.15H)
MFGR: BH ELECTRONICS; NoLoad: .; Approved: CL; G_PN: LSD0-05371; M_PN: L16-1008; level: 1; ModifyDate: 4/30/13; item_number: LSD0-05371
footprint L16_BH ELECTRONICS (Footprint not found)
footprint L16_BH_ELECTRONICS
pins: 1 Pri+, 2 Pri-, 3 Sec-, 4 Sec+
